# Altium footprint library MyComponents_v2.5.PcbLib: 403 footprints (part 8 of 26)
Each footprint in its own frame and in the unit in brackets; x right, y up, seen from the top. Pads: shape width x height; smd on the part's side, far side on the other; paste and mask are expansions set on the pad; w line width, h text height; cw(c..) or ccw(c..) is an arc to the next point about the centre after c.
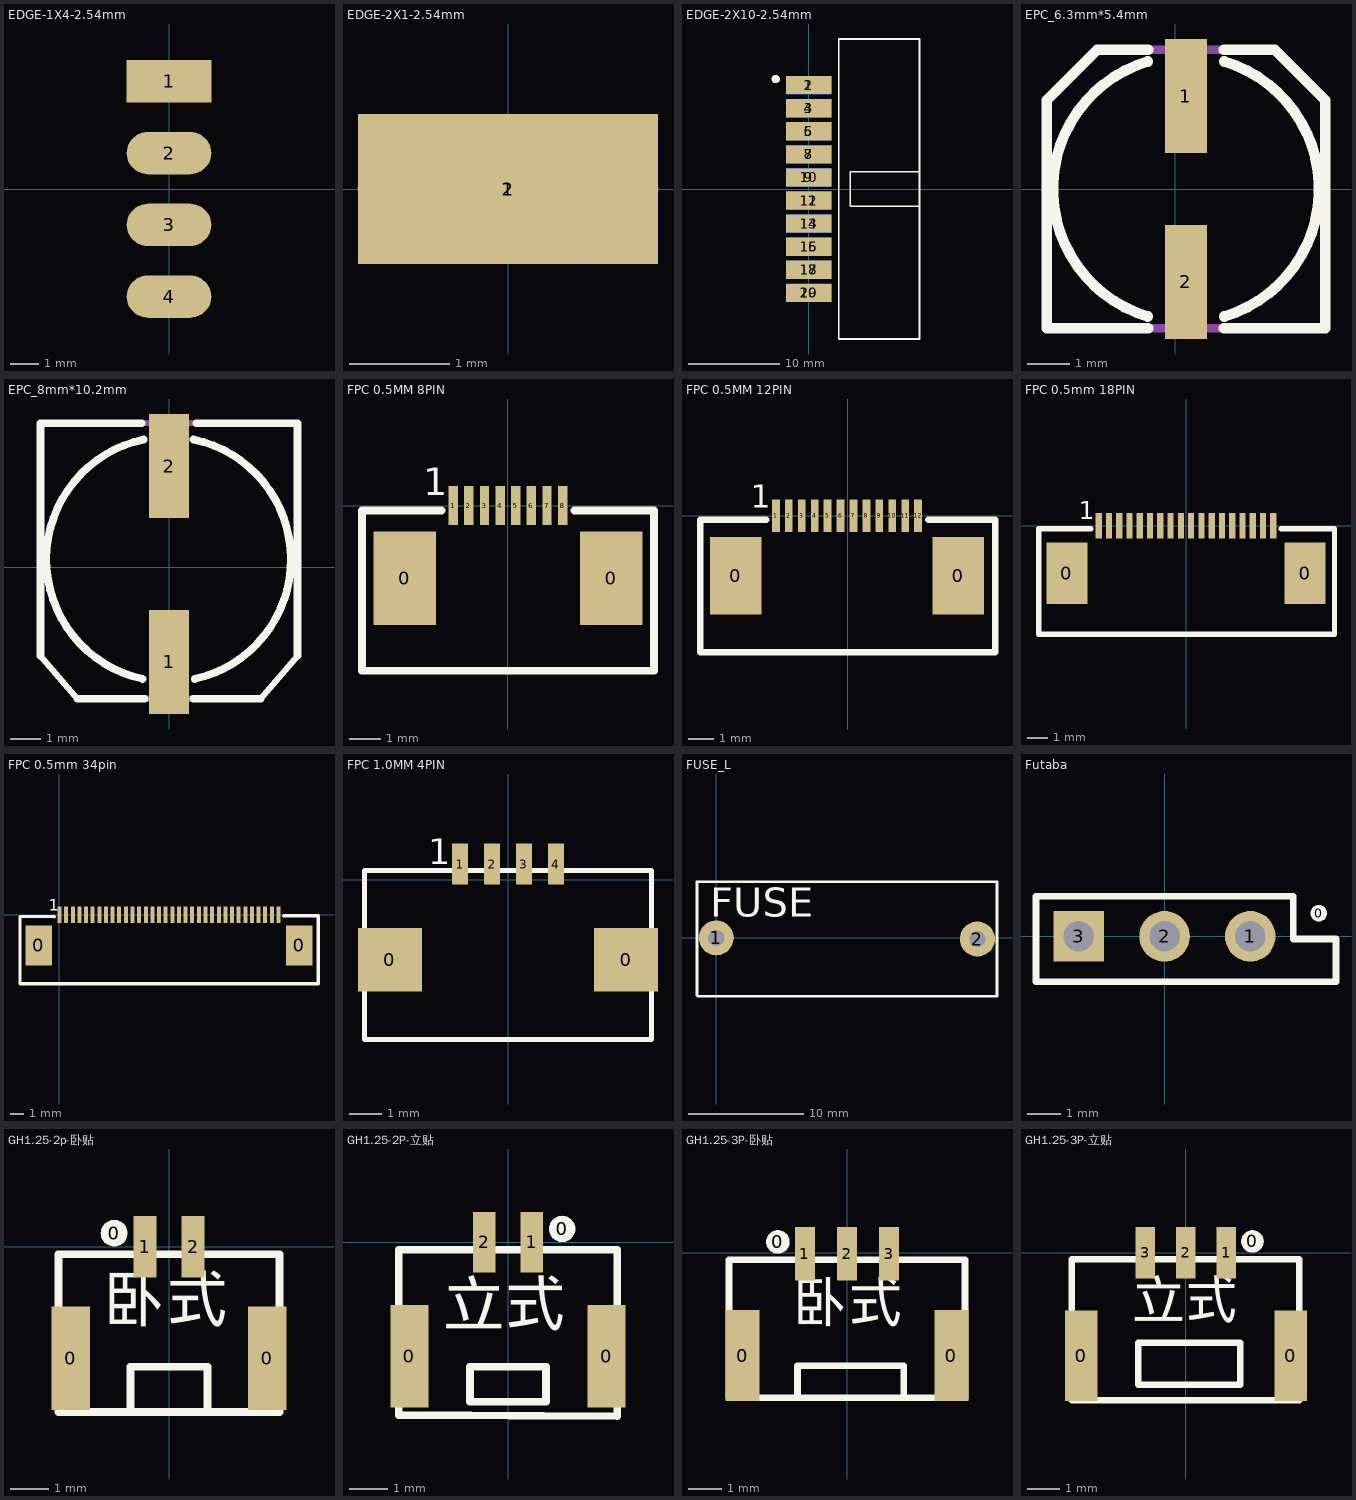
[diagram p7: the footprints below, top view; thin cyan lines are the x and y axes]

## EDGE-1X4-2.54mm [mm] "1X4引脚 间距2.54mm 金手指"
pads (4):
  rect 3x1.5 smd: 1(0,3.81)
  oval 3x1.5 smd: 2(0,1.27) 3(0,-1.27) 4(0,-3.81)

## EDGE-2X1-2.54mm [mm] "2X1引脚 间距2.54mm 金手指"
pads (2):
  rect 3x1.5 smd: 1(0,0)
  oval 3x1.5 smd far side: 2(0,0)

## EDGE-2X10-2.54mm [mm] "2X10引脚 间距2.54mm 金手指"
pads (20):
  rect 5x2 smd: 1(0,11.43) 3(0,8.89) 5(0,6.35) 7(0,3.81) 9(0,1.27) 11(0,-1.27) 13(0,-3.81) 15(0,-6.35) 17(0,-8.89) 19(0,-11.43)
  rect 5x2 smd far side: 2(0,11.43) 4(0,8.89) 6(0,6.35) 8(0,3.81) 10(0,1.27) 12(0,-1.27) 14(0,-3.81) 16(0,-6.35) 18(0,-8.89) 20(0,-11.43)
Top Overlay:
  circle w0.635: c-3.636,12.1 r0.136
  lines w0.203: 12.192,-1.905 4.572,-1.905 4.572,1.905 12.192,1.905 ; 3.302,-16.51 12.192,-16.51 12.192,16.51 3.302,16.51 3.302,1.905 3.302,-1.905 3.302,-16.51
Bottom Overlay:
  lines w0.203: 3.302,-16.51 3.302,-1.905 3.302,1.905 3.302,16.51 12.192,16.51 12.192,-16.51 3.302,-16.51
3D body "User Library-LP20V.STEP": height 4.45, standoff -4.75, extent -1.13,-16.5 11.53,16.52

## EPC_6.3mm*5.4mm [mm]
height 5.4
pads (2):
  rect 1x2.7 smd: 1(0.254,2.2) 2(0.254,-2.2)
Top Overlay:
  lines w0.25: -0.651,-3.018 cw(c0.254,0) -0.651,3.018 ; -0.646,-3.3 -3.046,-3.3 -3.046,2.1 -1.846,3.3 -0.646,3.3 ; 1.154,-3.3 3.554,-3.3 3.554,2.1 2.354,3.3 1.154,3.3 ; 1.159,-3.018 ccw(c0.254,0) 1.159,3.018
Mechanical 13:
  lines w0.2: -3.046,-3.3 3.554,-3.3 3.554,2.1 2.354,3.3 -1.846,3.3 -3.046,2.1 -3.046,-3.3
3D body: height 1.5, standoff 0.1, extent -3.046,-3.3 3.554,3.3
3D body: height 7.7, standoff 1.5, extent -2.896,-3.15 3.404,3.15

## EPC_8mm*10.2mm [mm]
height 10.2
pads (2):
  rect 1.3x3.4 smd: 1(-0.013,-3.102)
  rect 1.3x3.4 smd paste+0 mask+0.102: 2(-0.013,3.298)
Top Overlay:
  lines w0.2: -4.213,-2.902 -3.013,-4.302 ; 2.987,-4.302 4.187,-2.902
  lines w0.25: -4.213,-2.902 -4.213,4.698 -0.913,4.698 ; -3.013,-4.302 -0.813,-4.302 ; 0.787,-4.302 2.987,-4.302 ; 0.887,4.698 4.087,4.698 ; 4.187,-2.902 4.187,4.698
  lines w0.254: -0.877,-3.657 cw(c-0.02,0.25) -0.838,4.166 ; 0.787,4.166 cw(c-0.03,0.25) 0.826,-3.657
Mechanical 13:
  lines w0.2: -4.213,-2.002 -4.213,4.698 4.087,4.698 ; -2.113,-4.302 2.087,-4.302 ; 4.187,-2.002 4.187,4.698
3D body: height 1.5, standoff 0.1, extent -4.213,-4.302 4.187,4.698

## FPC 0.5MM 8PIN [mm]
pads (10):
  rect 2x3 smd: 0(-3.3,-2.325) 0(3.3,-2.325)
  rect 0.3x1.25 smd: 1(-1.75,0) 2(-1.25,0) 3(-0.75,0) 4(-0.25,0) 5(0.25,0) 6(0.75,0) 7(1.25,0) 8(1.75,0)
Top Overlay:
  lines w0.254: -2.131,-0.152 -4.671,-0.152 -4.671,-5.283 0.75,-5.283 ; -0.75,-5.283 4.671,-5.283 4.671,-0.152 2.131,-0.152
  text "1" at -2.715,0.025 h1.52
3D body "FPC0.5-8p.stp": height 2.05, standoff 0, extent -4.715,-4.91 4.715,0.2

## FPC 0.5MM 12PIN [mm]
pads (14):
  rect 2x3 smd: 0(-4.325,-2.32) 0(4.275,-2.32)
  rect 0.3x1.25 smd: 1(-2.775,0.005) 2(-2.275,0.005) 3(-1.775,0.005) 4(-1.275,0.005) 5(-0.775,0.005) 6(-0.275,0.005) 7(0.225,0.005) 8(0.725,0.005) 9(1.225,0.005) 10(1.725,0.005) 11(2.225,0.005) 12(2.725,0.005)
Top Overlay:
  lines w0.254: -3.156,-0.148 -5.696,-0.148 -5.696,-5.278 5.706,-5.278 5.706,-0.148 3.115,-0.148
  text "1" at -3.74,0.03 h1.52
3D body "FPC0.5mm-12.stp": height 1.27, standoff -0.03, extent -4.25,-4 4.25,-0.25

## FPC 0.5mm 18PIN [mm] "0.5mmFPC插座 18pin"
pads (20):
  rect 2x3 smd: 0(-5.8,-2.325) 0(5.8,-2.325)
  rect 0.3x1.25 smd: 1(-4.25,0) 2(-3.75,0) 3(-3.25,0) 4(-2.75,0) 5(-2.25,0) 6(-1.75,0) 7(-1.25,0) 8(-0.75,0) 9(-0.25,0) 10(0.25,0) 11(0.75,0) 12(1.25,0) 13(1.75,0) 14(2.25,0) 15(2.75,0) 16(3.25,0) 17(3.75,0) 18(4.25,0)
Top Overlay:
  lines w0.254: -4.631,-0.152 -7.171,-0.152 -7.171,-5.283 7.231,-5.283 7.231,-0.152 4.64,-0.152
  text "1" at -5.215,0.025 h1.52
3D body "1-1734839-8.stp": height 2, standoff -0.05, extent -7.199,-5.264 7.231,-0.154

## FPC 0.5mm 34pin [mm] "0.5间距FPC插座"
pads (36):
  rect 2x3 smd: 0(-1.55,-2.325) 0(18.05,-2.325)
  rect 0.3x1.25 smd: 1(0,0) 2(0.5,0) 3(1,0) 4(1.5,0) 5(2,0) 6(2.5,0) 7(3,0) 8(3.5,0) 9(4,0) 10(4.5,0) 11(5,0) 12(5.5,0) 13(6,0) 14(6.5,0) 15(7,0) 16(7.5,0) 17(8,0) 18(8.5,0) 19(9,0) 20(9.5,0) 21(10,0) 22(10.5,0) 23(11,0) 24(11.5,0) 25(12,0) 26(12.5,0) 27(13,0) 28(13.5,0) 29(14,0) 30(14.5,0) 31(15,0) 32(15.5,0) 33(16,0) 34(16.5,0)
Top Overlay:
  lines w0.254: -0.381,-0.152 -2.973,-0.145 -2.972,-5.207 19.507,-5.207 19.507,-0.102 16.891,-0.102
  text "1" at -0.813,0 h1.52
3D body "3-1734592-4.stp": height 2.04, standoff -0.01, extent -2.973,-5.255 19.457,-0.145

## FPC 1.0MM 4PIN [mm] "1.0mm FPC ，4p"
pads (6):
  rect 2x2 smd: 0(-3.7,-2.5) 0(3.7,-2.5)
  rect 0.5x1.3 smd: 1(-1.5,0.5) 2(-0.5,0.5) 3(0.5,0.5) 4(1.5,0.5)
Top Overlay:
  lines w0.15: -4.5,-5 -4.5,0.3 4.5,0.3 4.5,-5 -4.5,-5
  text "1" at -2.5,0.5 h0.8

## FUSE_L [mil]
pads (2):
  round 120 hole 55.12: 1(0,0) 2(894,-4)
Top Overlay:
  lines w10: -66,-169 -66,192 ; -61,-200 961,-200 ; -44,-200 961,-200 ; -22,-200 -63,-200 -66,-197 -66,192 ; 150,-200 750,-200 ; -66,192 -49,192 961,192 ; -66,192 961,192 ; 961,-200 961,192 ; 961,-200 961,192
  text "FUSE" at -21,73 h100

## Futaba [mm]
pads (4):
  round 0.5 on Top Overlay: 0(4.572,0.682)
  round 1.5 hole 0.9: 1(2.54,0) 2(0,0)
  rect 1.5x1.5 hole 0.9: 3(-2.54,0)
Top Overlay:
  lines w0.2: -3.81,-1.35 -3.81,1.19 3.81,1.19 3.81,-0.08 5.08,-0.08 5.08,-1.35 -3.81,-1.35
3D body "header2.54_3x1.step": height 8.38, standoff -2.54, extent -3.923,-1.275 3.823,1.265

## GH1.25-2p-卧贴 [mm]
pads (5):
  rect 1x2.7 smd: 0(-2.55,-2.9) 0(2.55,-2.9)
  round 0.7 on Top Overlay: 0(-1.425,0.35)
  rect 0.6x1.6 smd: 1(-0.625,0) 2(0.625,0)
Top Overlay:
  lines w0.2: -1,-4.25 -1,-3.125 1,-3.125 1,-4.275 ; -2.875,-4.3 -2.875,-0.2 2.875,-0.2 2.875,-4.3 -2.875,-4.3
  text "卧式" at -1.7,-2.325 h2.03
3D body "GH1.25 2p.STEP": height 4.4, standoff -0.05, extent -2.875,-4.3 2.875,0.5

## GH1.25-2P-立贴 [mm]
pads (5):
  rect 1x2.7 smd: 0(-2.6,-3) 0(2.6,-3)
  round 0.7 on Top Overlay: 0(1.425,0.35)
  rect 0.6x1.6 smd: 1(0.625,0) 2(-0.625,0)
Top Overlay:
  lines w0.2: 2.875,-4.579 -2.875,-4.55 -2.875,-0.2 2.875,-0.2 2.875,-4.55 ; -1,-4.2 1,-4.2 1,-3.275 -1,-3.275 -1,-4.2
  text "立式" at -1.7,-2.575 h2.03
3D body "GH1.25W-2p.STEP": height 4.13, standoff -0.13, extent -2.875,-4.55 2.875,0.552

## GH1.25-3P-卧贴 [mm] "1.25mm，额定电流1A，额定电压50V，接触电阻20mOhm"
height 4.25
pads (6):
  rect 1x2.7 smd: 0(-3.1,-3.05) 0(3.1,-3.05)
  round 0.7 on Top Overlay: 0(-2.05,0.325)
  rect 0.6x1.6 smd: 1(-1.25,-0.025) 2(0,-0.025) 3(1.25,-0.025)
Top Overlay:
  lines w0.2: -1.468,-4.271 -1.468,-3.35 1.682,-3.35 1.682,-4.246 ; -3.5,-4.3 -3.5,-0.2 3.5,-0.2 3.5,-4.3 -3.5,-4.3
  text "卧式" at -1.6,-2.45 h2.03
3D body "SM03B-GHS-TB.step": height 4.4, standoff 0.05, extent -3.55,-4.275 3.45,0.575

## GH1.25-3P-立贴 [mm] "1.25mm，额定电流1A，额定电压50V，接触电阻20mOhm"
height 4.25
pads (6):
  rect 1x2.8 smd: 0(-3.22,-3.175) 0(3.225,-3.175)
  round 0.7 on Top Overlay: 0(2.05,0.35)
  rect 0.6x1.6 smd: 1(1.25,0) 2(0,0) 3(-1.25,0)
Top Overlay:
  lines w0.2: -3.525,-4.55 3.485,-4.55 3.485,-0.2 -3.525,-0.2 -3.525,-4.55 ; -1.468,-4.075 1.682,-4.075 1.682,-2.772 -1.468,-2.772 -1.468,-4.075
  text "立式" at -1.65,-2.425 h2.03
3D body "GH1.25WF-3P.STEP": height 4.18, standoff -0.03, extent -3.52,-4.5 3.48,0.45